# Altium footprint library BBC_Footprints.PcbLib: 172 footprints (part 4 of 11)
Each footprint in its own frame and in the unit in brackets; x right, y up, seen from the top. Pads: shape width x height; smd on the part's side, far side on the other; paste and mask are expansions set on the pad; w line width, h text height; cw(c..) or ccw(c..) is an arc to the next point about the centre after c.
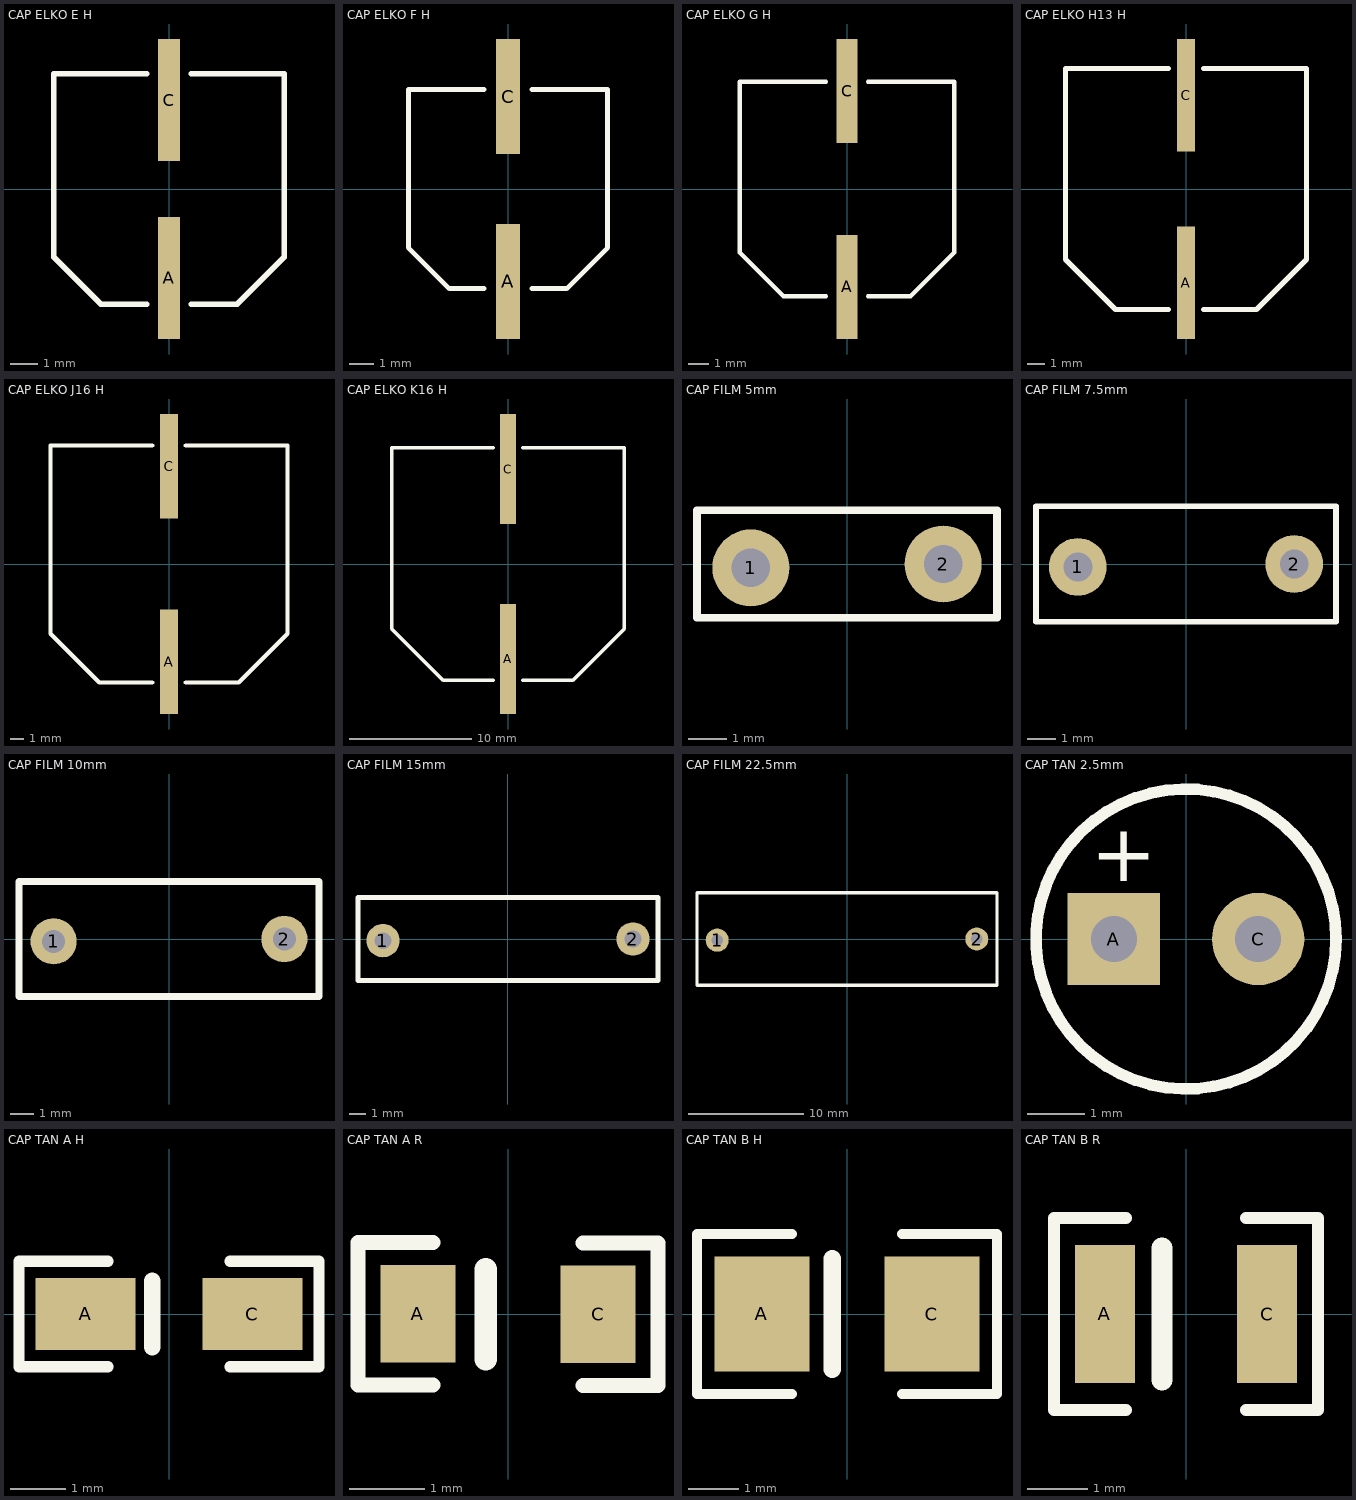
[diagram p3: the footprints below, top view; thin cyan lines are the x and y axes]

## CAP ELKO E H [mm] "aluminium electrolytic capacitor surface mount case E"
height 6.2
pads (2):
  rect 0.8x4.4 smd: A(0,-3.2) C(0,3.2)
Top Overlay:
  lines w0.2: -0.8,-4.15 -2.45,-4.15 -4.15,-2.45 -4.15,4.15 -0.8,4.15 ; 0.8,-4.15 2.45,-4.15 4.15,-2.45 4.15,4.15 0.8,4.15
3D body "CAP ELKO E.step": height 6.2, standoff -0.01, extent -4.15,-4.5 4.15,4.5

## CAP ELKO F H [mm] "aluminium electrolytic capacitor surface mount case F"
height 10.2
pads (2):
  rect 1x4.8 smd: A(0,-3.85) C(0,3.85)
Top Overlay:
  lines w0.2: -1,-4.15 -2.45,-4.15 -4.15,-2.45 -4.15,4.15 -1,4.15 ; 1,-4.15 2.45,-4.15 4.15,-2.45 4.15,4.15 1,4.15
3D body "CAP ELKO F.step": height 10.21, standoff -0.01, extent -4.15,-4.95 4.15,4.95

## CAP ELKO G H [mm] "aluminium electrolytic capacitor surface mount case G"
height 10.2
pads (2):
  rect 1x5 smd: A(0,-4.7) C(0,4.7)
Top Overlay:
  lines w0.2: -1,-5.15 -3.05,-5.15 -5.15,-3.05 -5.15,5.15 -1,5.15 ; 1,-5.15 3.05,-5.15 5.15,-3.05 5.15,5.15 1,5.15
3D body "CAP ELKO G.step": height 10.21, standoff -0.01, extent -5.15,-5.8 5.15,5.8

## CAP ELKO H13 H [mm] "aluminium electrolytic capacitor surface mount case H13"
height 13.5
pads (2):
  rect 1x6.3 smd: A(0,-5.25) C(0,5.25)
Top Overlay:
  lines w0.3: -1,-6.75 -3.95,-6.75 -6.75,-3.95 -6.75,6.75 -1,6.75 ; 1,-6.75 3.95,-6.75 6.75,-3.95 6.75,6.75 1,6.75
3D body "CAP ELKO H13.step": height 13.5, standoff -0.01, extent -6.75,-6.9 6.75,6.9

## CAP ELKO J16 H [mm] "aluminium electrolytic capacitor surface mount case J16"
height 16.5
pads (2):
  rect 1.3x7.5 smd: A(0,-7) C(0,7)
Top Overlay:
  lines w0.3: -1.2,-8.5 -5,-8.5 -8.5,-5 -8.5,8.5 -1.2,8.5 ; 1.2,-8.5 5,-8.5 8.5,-5 8.5,8.5 1.2,8.5
3D body "CAP ELKO J16.step": height 16.5, standoff -0.01, extent -8.5,-8.85 8.5,8.85

## CAP ELKO K16 H [mm] "aluminium electrolytic capacitor surface mount case K16"
height 16.5
pads (2):
  rect 1.3x9 smd: A(0,-7.75) C(0,7.75)
Top Overlay:
  lines w0.3: -1.2,-9.5 -5.3,-9.5 -9.5,-5.3 -9.5,9.5 -1.2,9.5 ; 1.2,-9.5 5.3,-9.5 9.5,-5.3 9.5,9.5 1.2,9.5
3D body "CAP ELKO K16.step": height 16.5, standoff -0.01, extent -9.5,-10.05 9.5,10.05

## CAP FILM 5mm [mm] "film capacitor with a 5mm pitch"
height 7
pads (2):
  round 2 hole 1: 1(-2.5,-0.1) 2(2.5,0)
Top Overlay:
  lines w0.2: -3.9,-1.4 -3.9,1.4 3.9,1.4 3.9,-1.4 -3.9,-1.4
3D body "User Library-Cap-5 (7_2x6_5x2_2).step": height 7.2, standoff -3.3, extent -3.6,-1.1 3.6,1.1

## CAP FILM 7.5mm [mm] "film capacitor with a 7.5mm pitch"
height 10
pads (2):
  round 2 hole 1: 1(-3.75,-0.1) 2(3.75,0)
Top Overlay:
  lines w0.2: -5.2,-2 5.2,-2 5.2,2 -5.2,2 -5.2,-2
3D body "CAP FILM 7.5mm.STEP": height 8.2, standoff -9.8, extent -4.4,-2 4.4,2

## CAP FILM 10mm [mm] "film capacitor with a 10mm pitch"
height 12
pads (2):
  round 2 hole 1: 1(-5,-0.1) 2(5,0)
Top Overlay:
  lines w0.3: -6.5,-2.5 6.5,-2.5 6.5,2.5 -6.5,2.5 -6.5,-2.5
3D body "User Library-Capacitor MKT_B32591C3104 (Pitch 10mm).step": height 13, standoff -5.5, extent -6.5,-2.5 6.5,2.5

## CAP FILM 15mm [mm] "film capacitor with a 15mm pitch"
height 12
pads (2):
  round 2 hole 1: 1(-7.5,-0.1) 2(7.5,0)
Top Overlay:
  lines w0.3: -9,-2.5 -9,2.5 9,2.5 9,-2.5 -9,-2.5
3D body "CAP FILM 15mm.step": height 11, standoff -2.6, extent -9,-2.5 9,2.5

## CAP FILM 22.5mm [mm] "film capacitor with a 22.5mm pitch"
height 20
pads (2):
  round 2 hole 1: 1(-11.25,-0.1) 2(11.25,0)
Top Overlay:
  lines w0.3: -13,-4 13,-4 13,4 -13,4 -13,-4
3D body "User Library-ECQE(F) 0_33uf 630Vdc 250Vac.step": height 18.2, standoff -3.8, extent -13,-3.9 13,3.9

## CAP TAN 2.5mm [mm]
pads (2):
  rect 1.6x1.6 hole 0.8: A(-1.25,0)
  round 1.6 hole 0.8: C(1.25,0)
Top Overlay:
  circle w0.2: c0,0 r2.6
  text "+" at -1.65,1 h1
3D body "CAP TAN 2.5mm.step": height 8.5, standoff -2.5, extent -2.174,-2.174 2.174,2.174

## CAP TAN A H [mm] "tantalum chip coapcitor casetype A for hand soldering"
height 1.6
pads (2):
  rect 1.8x1.3 smd: A(-1.5,0) C(1.5,0)
Top Overlay:
  lines w0.2: -1.1,-0.95 -2.7,-0.95 -2.7,0.95 -1.1,0.95 ; 1.1,-0.95 2.7,-0.95 2.7,0.95 1.1,0.95
  lines w0.3: -0.3,-0.6 -0.3,0.6
3D body "CAP TAN A.step": height 1.6, standoff 0, extent -1.6,-0.8 1.6,0.8

## CAP TAN A R [mm] "tantalum chip coapcitor casetype A for reflow soldering"
height 1.6
pads (2):
  rect 1x1.3 smd: A(-1.2,0) C(1.2,0)
Top Overlay:
  lines w0.2: -1,-0.95 -2,-0.95 -2,0.95 -1,0.95 ; 1,-0.95 2,-0.95 2,0.95 1,0.95
  lines w0.3: -0.3,-0.6 -0.3,0.6
3D body "CAP TAN A.step": height 1.6, standoff 0, extent -1.6,-0.8 1.6,0.8

## CAP TAN B H [mm] "tantalum chip coapcitor casetype B for hand soldering"
height 1.9
pads (2):
  rect 1.9x2.3 smd: A(-1.7,0) C(1.7,0)
Top Overlay:
  lines w0.2: -1.1,-1.6 -3,-1.6 -3,1.6 -1.1,1.6 ; 1.1,-1.6 3,-1.6 3,1.6 1.1,1.6
  lines w0.35: -0.3,-1.1 -0.3,1.1
3D body "CAP TAN B.step": height 1.9, standoff 0, extent -1.75,-1.4 1.75,1.4

## CAP TAN B R [mm] "tantalum chip coapcitor casetype B for reflow soldering"
height 1.9
pads (2):
  rect 1x2.3 smd: A(-1.35,0) C(1.35,0)
Top Overlay:
  lines w0.2: -1,-1.6 -2.2,-1.6 -2.2,1.6 -1,1.6 ; 1,-1.6 2.2,-1.6 2.2,1.6 1,1.6
  lines w0.35: -0.4,-1.1 -0.4,1.1
3D body "CAP TAN B.step": height 1.9, standoff 0, extent -1.75,-1.4 1.75,1.4